# Altium footprint library 模块库PCB.PcbLib: 6 footprints
Each footprint in its own frame and in the unit in brackets; x right, y up, seen from the top. Pads: shape width x height; smd on the part's side, far side on the other; paste and mask are expansions set on the pad; w line width, h text height; cw(c..) or ccw(c..) is an arc to the next point about the centre after c.
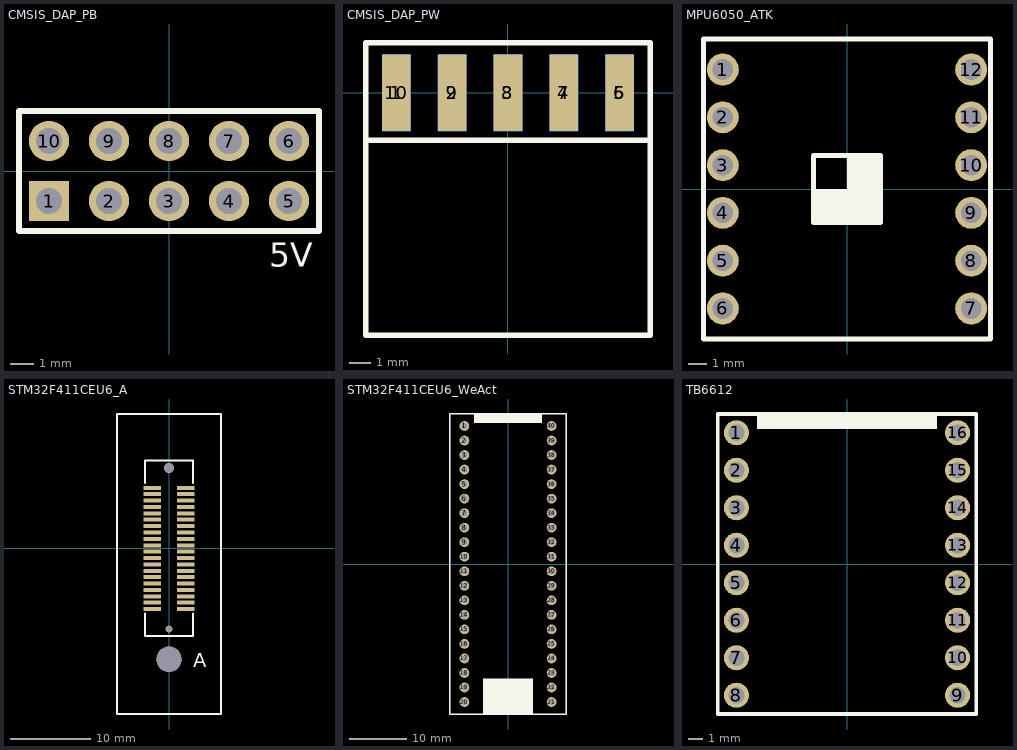
[diagram p0: the footprints below, top view; thin cyan lines are the x and y axes]

## CMSIS_DAP_PB [mm]
pads (10):
  rect 1.7x1.7 hole 1.1: 1(-5.08,-1.27)
  round 1.7 hole 1.1: 2(-2.54,-1.27) 3(0,-1.27) 4(2.54,-1.27) 5(5.08,-1.27) 6(5.08,1.27) 7(2.54,1.27) 8(0,1.27) 9(-2.54,1.27) 10(-5.08,1.27)
Top Overlay:
  lines w0.254: -6.35,-2.54 6.35,-2.54 6.35,2.54 -6.35,2.54 -6.35,-2.54
  text "5V" at 4.234,-4.064 h1.02
3D body "5P2.step": height 8.54, standoff -3, extent -6.35,-2.54 6.35,2.54

## CMSIS_DAP_PW [mm]
pads (10):
  rect 1.3x3.5 smd far side: 1(-5.08,0) 2(-2.54,0) 3(0,0) 4(2.54,0) 5(5.08,0)
  rect 1.3x3.5 smd: 6(5.08,0) 7(2.54,0) 8(0,0) 9(-2.54,0) 10(-5.08,0)
Top Overlay:
  lines w0.254: 3.937,-2.159 -6.477,-2.159 ; -6.477,-2.159 6.477,-2.159 ; -6.477,-2.159 -6.477,2.286 6.477,2.286 6.477,-2.159 ; -6.477,-2.159 -6.477,-11.049 6.477,-11.049 6.477,-2.159
Bottom Overlay:
  lines w0.254: -3.937,-2.159 6.477,-2.159 ; -6.477,-2.159 6.477,-2.159 ; -6.477,-2.159 -6.477,2.286 6.477,2.286 6.477,-2.159 ; -6.477,-2.159 -6.477,-11.049 6.477,-11.049 6.477,-2.159
  text "5V" at 5.926,2.794 h1.02
3D body "5P2.step": height 2.34, standoff -2.74, extent -6.35,-10.953 6.35,0.587

## MPU6050_ATK [mm]
pads (12):
  round 1.7 hole 1.1: 1(-6.6,6.35) 2(-6.6,3.81) 3(-6.6,1.27) 4(-6.6,-1.27) 5(-6.6,-3.81) 6(-6.6,-6.35) 7(6.6,-6.35) 8(6.6,-3.81) 9(6.6,-1.27) 10(6.6,1.27) 11(6.6,3.81) 12(6.6,6.35)
Top Overlay:
  rectangle: -1.778,-1.778 1.397,0
  rectangle: 0,-1.651 1.778,1.778
  rectangle: 0,-1.778 1.778,0
  lines w0.254: -7.623,-7.973 7.623,-7.973 7.623,7.973 -7.623,7.973 -7.623,-7.973 ; -1.778,-1.778 1.778,-1.778 1.778,1.778 -1.778,1.778 -1.778,-1.778
3D body "6P.step": height 8.54, standoff -3, extent 5.33,-7.62 7.87,7.62
3D body "6P.step": height 8.54, standoff -3, extent -7.87,-7.62 -5.33,7.62

## STM32F411CEU6_A [mm]
pads (41):
  rect 2.2x0.5 smd: 1(-2.12,7.6) 2(-2.12,6.8) 3(-2.12,6) 4(-2.12,5.2) 5(-2.12,4.4) 6(-2.12,3.6) 7(-2.12,2.8) 8(-2.12,2) 9(-2.12,1.2) 10(-2.12,0.4) 11(-2.12,-0.4) 12(-2.12,-1.2) 13(-2.12,-2) 14(-2.12,-2.8) 15(-2.12,-3.6) 16(-2.12,-4.4) 17(-2.12,-5.2) 18(-2.12,-6) 19(-2.12,-6.8) 20(-2.12,-7.6) 21(2.12,-7.6) 22(2.12,-6.8) 23(2.12,-6) 24(2.12,-5.2) 25(2.12,-4.4) 26(2.12,-3.6) 27(2.12,-2.8) 28(2.12,-2) 29(2.12,-1.2) 30(2.12,-0.4) 31(2.12,0.4) 32(2.12,1.2) 33(2.12,2) 34(2.12,2.8) 35(2.12,3.6) 36(2.12,4.4) 37(2.12,5.2) 38(2.12,6) 39(2.12,6.8) 40(2.12,7.6)
  round 3.175 hole 3.175: ""(0,-13.887)
via 0,-10.1 diameter 0.9 hole 0.8
via 0,10.1 diameter 1.25 hole 1.2
Top Overlay:
  lines w0.254: -3,-8.176 -3,-11 3,-11 3,-8.176 ; -3,8.176 -3,11 3,11 3,8.176 ; -6.54,-20.745 6.54,-20.745 6.54,16.847 -6.54,16.847 -6.54,-20.745
  text "A" at 3.031,-15.538 h3.05
3D body "BTB-40P-M.step": height 4.6, standoff -1.38, extent -3.222,-10.9 3.175,10.9

## STM32F411CEU6_WeAct [mm]
pads (40):
  round 1.7 hole 1.1: 1(-7.62,24.13) 2(-7.62,21.59) 3(-7.62,19.05) 4(-7.62,16.51) 5(-7.62,13.97) 6(-7.62,11.43) 7(-7.62,8.89) 8(-7.62,6.35) 9(-7.62,3.81) 10(-7.62,1.27) 11(-7.62,-1.27) 12(-7.62,-3.81) 13(-7.62,-6.35) 14(-7.62,-8.89) 15(-7.62,-11.43) 16(-7.62,-13.97) 17(-7.62,-16.51) 18(-7.62,-19.05) 19(-7.62,-21.59) 20(-7.62,-24.13) 21(7.62,-24.13) 22(7.62,-21.59) 23(7.62,-19.05) 24(7.62,-16.51) 25(7.62,-13.97) 26(7.62,-11.43) 27(7.62,-8.89) 28(7.62,-6.35) 29(7.62,-3.81) 30(7.62,-1.27) 31(7.62,1.27) 32(7.62,3.81) 33(7.62,6.35) 34(7.62,8.89) 35(7.62,11.43) 36(7.62,13.97) 37(7.62,16.51) 38(7.62,19.05) 39(7.62,21.59) 40(7.62,24.13)
Top Overlay:
  rectangle: -4.381,-26.226 4.381,-20.002
  rectangle: -5.969,24.638 5.969,26.162
  lines w0.254: -10.223,-26.226 10.223,-26.226 10.223,26.226 -10.223,26.226 -10.223,-26.226
3D body "20P.step": height 8.54, standoff -3, extent -8.89,-25.4 -6.35,25.4
3D body "20P.step": height 8.54, standoff -3, extent 6.35,-25.4 8.89,25.4

## TB6612 [mm]
pads (16):
  round 1.7 hole 1.1: 1(-7.493,8.89) 2(-7.493,6.35) 3(-7.493,3.81) 4(-7.493,1.27) 5(-7.493,-1.27) 6(-7.493,-3.81) 7(-7.493,-6.35) 8(-7.493,-8.89) 9(7.493,-8.89) 10(7.493,-6.35) 11(7.493,-3.81) 12(7.493,-1.27) 13(7.493,1.27) 14(7.493,3.81) 15(7.493,6.35) 16(7.493,8.89)
Top Overlay:
  rectangle: -6.096,9.144 6.096,10.16
  lines w0.254: -8.763,-10.16 8.763,-10.16 8.763,10.16 -8.763,10.16 -8.763,-10.16
3D body "8P.step": height 8.54, standoff -3, extent -8.763,-10.16 -6.223,10.16
3D body "8P.step": height 8.54, standoff -3, extent 6.223,-10.16 8.763,10.16